# Altium integrated library Telephone.IntLib: 113 symbols
Pins are listed as number, name and electrical type; pins without a type are passive.

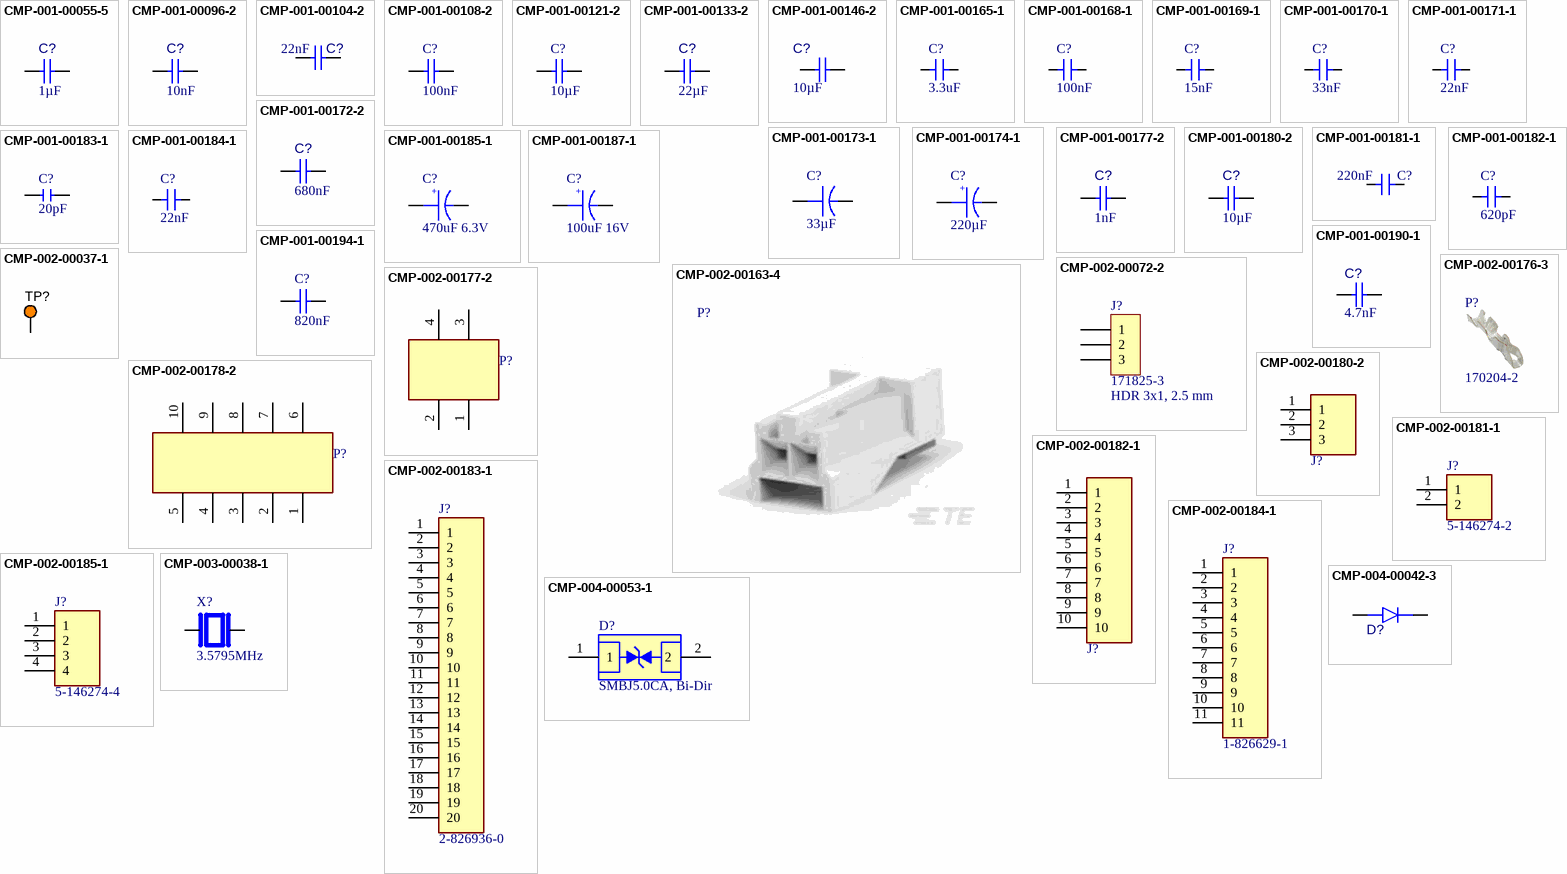
[diagram p0: symbols CMP-001-00055-5 to CMP-004-00053-1]

## CMP-001-00055-5
designator C?, comment value 1µF  (hidden comment: CL10A105KA8NNNC)
Ceramic capacitor SMD-0603 1000nF/25V X7R# K +-10%, Samsung, RoHS; Manufacturer: TDK; Manufacturer Part Number: CGA3E3X5R1E105K080AB; Manufacturer: Yageo; Manufacturer Part Number: CC0603KRX5R8BB105; Manufacturer Part Number: CL10A105KA8NFNC; Manufacturer: Sams; Voltage Rating: 25V; Tolerance: 10%; Dielectric: X5R; Pins: 2; RoHS Compliant: Yes; Mounting Technology: Surface Mount; Capacitor Type: Ceramic; Min Operating Temperature: -55°C; Case/Package: 0603; Max Operating Temperature: 85°C; Depth: 0.8mm; Height: 0.8mm; Lead Free: Lead Free; Length: 1.6mm; Series: CL; Voltage: 25V; Voltage Rating (DC): 25V; Manufacturer: Samsung; Manufacturer Part Number: CL10A105KA8NNNC; Component Type: Capacitors
footprint CAPC0603(1608)100_L (Chip Capacitor, Body 1.6x0.8mm, Height 1.0mm, IPC High Density)
pins: 1, 2

## CMP-001-00096-2
designator C?, comment value 10nF  (hidden comment: 06035C103KAT2A)
0603 10nF 50 V ±10 % Tolerance X7R Surface Mount Multilayer Ceramic Capacitor; Manufacturer: Kyocera AVX; Voltage Rating: 50V; Tolerance: 10%; Dissipation Factor: 2.5%; Insulation Resistance: 100GR; Case/Package: 0603; Pins: 2; Min Operating Temperature: -55°C; Max Operating Temperature: 125°C; Design Item ID: 06035C103KAT2A; Case Code (Metric): 1608; Category: Ceramic Capacitors; Contact Plating: Tin,Matte; Depth: 0.81mm; Dielectric: X7R; Dielectric Material: Ceramic; Height: 0.9mm; Lead Free: Lead Free; Length: 1.6mm; Manufacturer Part Number: 06035C103KAT2A; Mount: Surface Mount,PCB; Packaging: Tape and Reel; Radiation Hardening: No; REACH SVHC: No SVHC; RoHS: Yes; Stock 1: 4334081; Termination: SMD/SMT; Thickness: 0.035inch; Voltage: 50V; Voltage Rating (DC): 50V; Width: 0.032inch; ComponentLink1Description: https://datasheet.ciiva.com/2987/cx7r-2987824.pdf?src-supplier=Avnet; ComponentLink1URL: https://datasheet.ciiva.com/2987/cx7r-2987824.pdf?src-supplier=Avnet; ComponentLink2Description: https://datasheet.ciiva.com/1124/1679506-1124848.pdf?src-supplier=Element14; ComponentLink2URL: https://datasheet.ciiva.com/1124/1679506-1124848.pdf?src-supplier=Element14; ComponentLink3Description: https://datasheet.ciiva.com/7855/1679506-7855082.pdf?src-supplier=Element14; ComponentLink3URL: https://datasheet.ciiva.com/7855/1679506-7855082.pdf?src-supplier=Element14; ComponentLink4Description: https://datasheet.ciiva.com/150/cx7r-150227.pdf?src-supplier=Digi-Key; ComponentLink4URL: https://datasheet.ciiva.com/150/cx7r-150227.pdf?src-supplier=Digi-Key; ComponentLink5Description: https://datasheet.ciiva.com/150/cx7r-150229.pdf?src-supplier=Digi-Key; ComponentLink5URL: https://datasheet.ciiva.com/150/cx7r-150229.pdf?src-supplier=Digi-Key; Component Type: Capacitors
footprint C0603
pins: 1, 2

## CMP-001-00104-2
designator C?, comment value 22nF  (hidden comment: VJ0603Y223JXAAC)
Cap Ceramic 0.022uF 50V X7R 5% SMD 0603 150C Paper T/R; Manufacturer 1: Vishay Vitramon; Case/Package: 0603; RoHS Compliant: Yes; Min Operating Temperature: -55°C; Max Operating Temperature: 150°C; Tolerance: 5%; Design Item ID: VJ0603Y223JXAAC; Category: Ceramic Capacitors; Construction: Flat; Depth: 0.8mm; Dielectric: X7R; Length: 1.6mm; Manufacturer Part Number 1: VJ0603Y223JXAAC; Packaging: Tape and Reel; Radiation Hardening: No; RoHS: Yes; Voltage Rating (DC): 50V; ComponentLink1Description: http://components.arrow.com/part/dataview/0323_01552007?src-supplier=Arrow+Europe; ComponentLink1URL: http://components.arrow.com/part/dataview/0323_01552007?src-supplier=Arrow+Europe; ComponentLink2Description: http://www.vishay.com/docs/45199/vjcommercialseries.pdf?src-supplier=Digi-Key; ComponentLink2URL: http://www.vishay.com/docs/45199/vjcommercialseries.pdf?src-supplier=Digi-Key; ComponentLink3Description: http://www.vishay.com/docs/45199/commseri.pdf?src-supplier=Avnet; ComponentLink3URL: http://www.vishay.com/docs/45199/commseri.pdf?src-supplier=Avnet; ComponentLink4Description: http://www.vishay.com/docs/45199/commseri.pdf?src-supplier=Avnet+Europe; ComponentLink4URL: http://www.vishay.com/docs/45199/commseri.pdf?src-supplier=Avnet+Europe; Mounting Technology: Surface Mount; Pins: 2; Component Type: Capacitors
footprint C0603
pins: 1, 2

## CMP-001-00108-2
designator C?, comment value 100nF  (hidden comment: CC0603KRX7R8BB104)
YAGEO - CC0603KRX7R8BB104 - CERAMIC CAPACITOR, 0.1UF, 25V, X7R, 10%, 0603, FULL REEL; Case/Package: 0603; Pins: 2; RoHS Compliant: Yes; Min Operating Temperature: -55°C; Max Operating Temperature: 125°C; Voltage Rating: 25V; Tolerance: 10%; Design Item ID: CC0603KRX7R8BB104; Case Code (Metric): 1608; Category: Ceramic Capacitors; Depth: 0.8mm; Dielectric: X7R; Halogen Free: Halogen Free; Height: 0.8mm; Lead Free: Lead Free; Length: 1.6mm; Manufacturer 1: Yageo; Manufacturer Part Number 1: CC0603KRX7R8BB104; Mount: Surface Mount; Package Quantity: 1; Packaging: Tape and Reel; Pricing 1: 1=0.10000, 10=0.05000, 50=0.02720, 100=0.02220, 500=0.01586, 1000=0.01246 (USD); Radiation Hardening: No; REACH SVHC: Unknown; Resistor Type: Ceramic; RoHS: Yes; Series: CC; Source: PTZLib.SchLib; Stock 1: 4053185; Termination: SMD/SMT; Thickness: 0.035inch; Voltage: 25V; Voltage Rating (DC): 25V; Width: 0.8mm; ComponentLink1Description: https://datasheet.ciiva.com/144/mlccorderingcode-144075.pdf?src-supplier=Digi-Key; ComponentLink1URL: https://datasheet.ciiva.com/144/mlccorderingcode-144075.pdf?src-supplier=Digi-Key; ComponentLink2Description: https://datasheet.ciiva.com/11786/0900766b80c10176-11786120.pdf?src-supplier=RSComponents; ComponentLink2URL: https://datasheet.ciiva.com/11786/0900766b80c10176-11786120.pdf?src-supplier=RSComponents; ComponentLink3Description: https://datasheet.ciiva.com/7978/1489800-7978155.pdf?src-supplier=Element14; ComponentLink3URL: https://datasheet.ciiva.com/7978/1489800-7978155.pdf?src-supplier=Element14; ComponentLink4Description: https://datasheet.ciiva.com/28450/1489800-28450584.pdf?src-supplier=Element14; ComponentLink4URL: https://datasheet.ciiva.com/28450/1489800-28450584.pdf?src-supplier=Element14; ComponentLink5Description: https://datasheet.ciiva.com/144/mlccorderingcode-144074.pdf?src-supplier=Digi-Key; ComponentLink5URL: https://datasheet.ciiva.com/144/mlccorderingcode-144074.pdf?src-supplier=Digi-Key; ComponentLink6Description: https://datasheet.ciiva.com/144/mlccorderingcode-144073.pdf?src-supplier=Digi-Key; ComponentLink6URL: https://datasheet.ciiva.com/144/mlccorderingcode-144073.pdf?src-supplier=Digi-Key; ComponentLink7Description: https://datasheet.ciiva.com/13389/upy-gphc-x7r-6-3v-to-50v-8-13389352.pdf?src-supplier=Mouser; ComponentLink7URL: https://datasheet.ciiva.com/13389/upy-gphc-x7r-6-3v-to-50v-8-13389352.pdf?src-supplier=Mouser; ComponentLink8Description: https://datasheet.ciiva.com/11587/upy-gphc-x7r-6-3v-to-50v-8-11587208.pdf?src-supplier=Avnet; ComponentLink8URL: https://datasheet.ciiva.com/11587/upy-gphc-x7r-6-3v-to-50v-8-11587208.pdf?src-supplier=Avnet; ComponentLink9Description: https://datasheet.ciiva.com/26829/getdatasheetpartid-403577-26829431.pdf?src-supplier=Verical; ComponentLink9URL: https://datasheet.ciiva.com/26829/getdatasheetpartid-403577-26829431.pdf?src-supplier=Verical; ComponentLink10Description: https://datasheet.ciiva.com/17434/upy-gphc-x7r-6-3v-to-50v-8-17434263.pdf?src-supplier=Avnet+Europe; ComponentLink10URL: https://datasheet.ciiva.com/17434/upy-gphc-x7r-6-3v-to-50v-8-17434263.pdf?src-supplier=Avnet+Europe; Component Type: Capacitors
footprint C0603
pins: 1, 2

## CMP-001-00121-2
designator C?, comment value 10µF  (hidden comment: GRM32ER7YA106KA12L)
Capacitor 10 uF 35 VDC 1210, GRM32ER7YA106KA12L, Murata; Voltage Rating: 35V; Tolerance: 10%; Dielectric: X7R; Material: Ceramic; Case/Package: 1210; RoHS Compliant: Yes; Min Operating Temperature: -55°C; Max Operating Temperature: 125°C; Design Item ID: GRM32ER7YA106KA12L; Case Code (Metric): 3225; Category: Ceramic Capacitors; Construction: Flat; Depth: 2.5mm; Height: 2.5mm; Lead Free: Lead Free; Length: 3.2mm; Manufacturer 1: Murata; Manufacturer Part Number 1: GRM32ER7YA106KA12L; Mount: Surface Mount; Package Quantity: 1; Packaging: Tape and Reel; Pricing 1: 1=0.96000, 10=0.72800, 50=0.60520, 100=0.52110, 500=0.40344 (USD); Radiation Hardening: No; REACH SVHC: No SVHC; RoHS: Yes; Series: GRM; Source: PTZLib.SchLib; Termination: SMD/SMT; Thickness: 0.106inch; Voltage: 35V; Voltage Rating (DC): 35V; Width: 2.5mm; ComponentLink1Description: https://datasheet.ciiva.com/22782/1747495-22782197.pdf?src-supplier=Farnell; ComponentLink1URL: https://datasheet.ciiva.com/22782/1747495-22782197.pdf?src-supplier=Farnell; ComponentLink2Description: https://datasheet.ciiva.com/3777/grm32er7ya106ka1223-3777248.pdf?src-supplier=Arrow+Electronics; ComponentLink2URL: https://datasheet.ciiva.com/3777/grm32er7ya106ka1223-3777248.pdf?src-supplier=Arrow+Electronics; ComponentLink3Description: https://datasheet.ciiva.com/11789/0900766b80ef921d-11789082.pdf?src-supplier=RSComponents; ComponentLink3URL: https://datasheet.ciiva.com/11789/0900766b80ef921d-11789082.pdf?src-supplier=RSComponents; ComponentLink4Description: https://datasheet.ciiva.com/29199/455226-da-01-en-vs-kondensator-1210-29199348.pdf?src-supplier=Conrad; ComponentLink4URL: https://datasheet.ciiva.com/29199/455226-da-01-en-vs-kondensator-1210-29199348.pdf?src-supplier=Conrad; ComponentLink5Description: https://datasheet.ciiva.com/29202/451166-da-01-de-vs-chip-kond-1210-10-0-uf-10pr-35-0v-x7r-29202478.pdf?src-supplier=Conrad; ComponentLink5URL: https://datasheet.ciiva.com/29202/451166-da-01-de-vs-chip-kond-1210-10-0-uf-10pr-35-0v-x7r-29202478.pdf?src-supplier=Conrad; ComponentLink6Description: https://datasheet.ciiva.com/143/partnumbering-e-01-143241.pdf?src-supplier=Digi-Key; ComponentLink6URL: https://datasheet.ciiva.com/143/partnumbering-e-01-143241.pdf?src-supplier=Digi-Key; ComponentLink7Description: https://datasheet.ciiva.com/143/partnumbering-e-01-143242.pdf?src-supplier=Digi-Key; ComponentLink7URL: https://datasheet.ciiva.com/143/partnumbering-e-01-143242.pdf?src-supplier=Digi-Key; ComponentLink8Description: https://datasheet.ciiva.com/11607/product-11607514.pdf?src-supplier=Avnet; ComponentLink8URL: https://datasheet.ciiva.com/11607/product-11607514.pdf?src-supplier=Avnet; ComponentLink9Description: https://datasheet.ciiva.com/14116/grmseries-highdielectrictype-eng-14116380.pdf?src-supplier=Distrelec; ComponentLink9URL: https://datasheet.ciiva.com/14116/grmseries-highdielectrictype-eng-14116380.pdf?src-supplier=Distrelec; ComponentLink10Description: https://datasheet.ciiva.com/7937/1747495-7937786.pdf?src-supplier=Element14; ComponentLink10URL: https://datasheet.ciiva.com/7937/1747495-7937786.pdf?src-supplier=Element14; Component Type: Capacitors
footprint C1210
pins: 1, 2

## CMP-001-00133-2
designator C?, comment value 22µF  (hidden comment: CL21A226KPCLRNC)
Cap Ceramic 22uF 10V X5R 10% SMD 0805 85C T/R; Manufacturer: Samsung; Capacitor Type: Ceramic Capacitors; Case/Package: 0805; Max Operating Temperature: 85°C; Min Operating Temperature: -55°C; Mounting Technology: Surface Mount; Pins: 2; RoHS Compliant: Yes; Tolerance: 10%; Voltage Rating: 10V; Case Code (Imperial): 0805; Case Code (Metric): 2012; Depth: 1.25mm; Dielectric: X5R; Lead Free: Lead Free; Length: 0.079inch; Packaging: Tape and Reel; Radiation Hardening: No; Series: CL; Thickness: 0.037inch; Width: 0.049inch; Manufacturer Part Number: CL21A226KPCLRNC; Component Type: Capacitors
footprint C0805
pins: 1, 2

## CMP-001-00146-2
designator C?, comment value 10µF  (hidden comment: C1210C106M5RACTU)
3225 C 10uF Ceramic Multilayer Capacitor; 50 V; +85degC; X7R Dielectric; +/-20%; Manufacturer: KEMET; Voltage Rating: 50V; Tolerance: 20%; Case/Package: 1210; RoHS Compliant: Yes; Min Operating Temperature: -55°C; Max Operating Temperature: 125°C; Design Item ID: C1210C106M5RACTU; Case Code (Metric): 3225; Category: Ceramic Capacitors; Component Type: Standard; Depth: 2.5mm; Dielectric: X7R; Dielectric Material: Ceramic; Height: 2.5mm; Length: 3.2mm; Manufacturer Part Number: C1210C106M5RACTU; Packaging: Tape and Reel; Thickness: 0.11inch; Voltage: 50V; Voltage Rating (DC): 50V; Weight: 0.000564oz; Width: 0.098inch; ComponentLink1Description: http://www.farnell.com/datasheets/2746479.pdf?src-supplier=Farnell; ComponentLink1URL: http://www.farnell.com/datasheets/2746479.pdf?src-supplier=Farnell; ComponentLink2Description: http://uk.rs-online.com/webdocs/1515/0900766b8151523a.pdf?src-supplier=RSComponents; ComponentLink2URL: http://uk.rs-online.com/webdocs/1515/0900766b8151523a.pdf?src-supplier=RSComponents; ComponentLink3Description: http://www.farnell.com/datasheets/2323917.pdf?src-supplier=Farnell; ComponentLink3URL: http://www.farnell.com/datasheets/2323917.pdf?src-supplier=Farnell; ComponentLink4Description: http://www.mouser.com/ds/2/212/KEM_C1002_X7R_SMD-357932.pdf?src-supplier=Mouser; ComponentLink4URL: http://www.mouser.com/ds/2/212/KEM_C1002_X7R_SMD-357932.pdf?src-supplier=Mouser; ComponentLink5Description: http://www.kemet.com/Lists/ProductCatalog/Attachments/53/KEM_C1002_X7R_SMD.pdf?src-supplier=Digi-Key; ComponentLink5URL: http://www.kemet.com/Lists/ProductCatalog/Attachments/53/KEM_C1002_X7R_SMD.pdf?src-supplier=Digi-Key; ComponentLink6Description: http://www.farnell.com/datasheets/2746479.pdf?src-supplier=Newark; ComponentLink6URL: http://www.farnell.com/datasheets/2746479.pdf?src-supplier=Newark; ComponentLink7Description: https://api.kemet.com/component-edge/download/datasheet/C1210C106M5RACTU.pdf?src-supplier=Digi-Key; ComponentLink7URL: https://api.kemet.com/component-edge/download/datasheet/C1210C106M5RACTU.pdf?src-supplier=Digi-Key; Mounting Technology: Surface Mount; Pins: 2; Component Type: Capacitors
footprint C1210
pins: 1, 2

## CMP-001-00165-1
designator C?  value 3.3uF  (hidden comment: CMP-001-00165-1)
Chip Capacitor 0603 MLCC X5R 3.3 uF+/- 10% 6.3 V T&R GP; Manufacturer: Walsin Technologies; Manufacturer Part Number: 0603X335K6R3CT; RoHS: Yes; Category: Ceramic Capacitors; Stock 1: 7326; Pricing 1: 1=0.2, 10=0.137, 50=0.137, 100=0.069, 1000=0.042, 10000=0.032 (USD); RoHS Compliant: Yes; Design Item ID: 0603X335K6R3CT; Component Type: Standard; Pin Count: 2; Source: V4-TEL.SCHLIB; Component Type: Capacitors
footprint 0603
pins: 1, 2

## CMP-001-00168-1
designator C?  value 100nF  (hidden comment: CMP-001-00168-1)
Capacitor, Ceramic; 0.1UF; Chip; Case 0805; +/-10%; 50WVDC; SMD; X7R; 2.5% Df; 0.037IN. ,; Manufacturer: Kyocera AVX; Manufacturer Part Number: 08055C104KAT2A; Tolerance: 10%; Voltage Rating (DC): 50V; RoHS: Yes; Category: Ceramic Capacitors; Stock 1: 2002566; Pricing 1: 1=0.1, 10=0.037, 50=0.037, 100=0.022, 1000=0.017, 10000=0.013 (USD); Case/Package: 0805; Case Code (Metric): 2012; Dielectric Material: Ceramic; Weight: 0.001411oz; Min Operating Temperature: -55°C; Max Operating Temperature: 125°C; Packaging: Cut Tape; Dielectric: X7R; Termination: Standard; Package Quantity: 4000; Series: MLCC X7R; Voltage: 50V; Length: 2mm; Width: 1.2mm; Height: 0.5mm; RoHS Compliant: Yes; Lead Free: Lead Free; ComponentLink1URL: https://datasheet.ciiva.com/11786/0900766b802d4698-11786116.pdf?src-supplier=Rs; ComponentLink1Description: https://datasheet.ciiva.com/11786/0900766b802d4698-11786116.pdf?src-supplier=Rs; ComponentLink2URL: https://datasheet.ciiva.com/19475/2009691-19475858.pdf?src-supplier=Jameco; ComponentLink2Description: https://datasheet.ciiva.com/19475/2009691-19475858.pdf?src-supplier=Jameco; ComponentLink3URL: https://datasheet.ciiva.com/2988/cx7r-2988014.pdf?src-supplier=Avnet; ComponentLink3Description: https://datasheet.ciiva.com/2988/cx7r-2988014.pdf?src-supplier=Avnet; ComponentLink4URL: https://datasheet.ciiva.com/16199/cx7r-16199014.pdf?src-supplier=Future+Electronics; ComponentLink4Description: https://datasheet.ciiva.com/16199/cx7r-16199014.pdf?src-supplier=Future+Electronics; ComponentLink5URL: https://datasheet.ciiva.com/11504/cx7r-11504044.pdf?src-supplier=Avnet; ComponentLink5Description: https://datasheet.ciiva.com/11504/cx7r-11504044.pdf?src-supplier=Avnet; ComponentLink6URL: https://datasheet.ciiva.com/150/cx7r-150258.pdf?src-supplier=Digi-Key; ComponentLink6Description: https://datasheet.ciiva.com/150/cx7r-150258.pdf?src-supplier=Digi-Key; ComponentLink7URL: https://datasheet.ciiva.com/150/cx7r-150257.pdf?src-supplier=Digi-Key; ComponentLink7Description: https://datasheet.ciiva.com/150/cx7r-150257.pdf?src-supplier=Digi-Key; ComponentLink8URL: https://datasheet.ciiva.com/150/cx7r-150259.pdf?src-supplier=Digi-Key; ComponentLink8Description: https://datasheet.ciiva.com/150/cx7r-150259.pdf?src-supplier=Digi-Key; ComponentLink9URL: https://datasheet.ciiva.com/7812/cx7r-7812079.pdf?src-supplier=Element14; ComponentLink9Description: https://datasheet.ciiva.com/7812/cx7r-7812079.pdf?src-supplier=Element14; ComponentLink10URL: https://datasheet.ciiva.com/5416/cx7r-5416959.pdf?src-supplier=Mouser; ComponentLink10Description: https://datasheet.ciiva.com/5416/cx7r-5416959.pdf?src-supplier=Mouser; Design Item ID: 08055C104KAT2A; Component Type: Standard; Pin Count: 2; Source: V4-TEL.SCHLIB; Component Type: Capacitors
footprint 0805
pins: 1, 2

## CMP-001-00169-1
designator C?  value 15nF  (hidden comment: CMP-001-00169-1)
Multilayer Ceramic Capacitor, 0.015 F, 10%, X7R, 50 V, 0805 [2012 Metric] RoHS Compliant: Yes; Manufacturer: Walsin Technologies; Manufacturer Part Number: 0805B153K500CT; Voltage Rating: 50V; RoHS: Yes; Category: Ceramic Capacitors; Stock 1: 4000; Pricing 1: 1=0.1, 10=0.071, 50=0.071, 100=0.032, 1000=0.019, 10000=0.016 (USD); Case/Package: 0805; Case Code (Metric): 2012; Min Operating Temperature: -55°C; Max Operating Temperature: 125°C; Tolerance: 10%; Packaging: Tape and Reel; Dielectric: X7R; Voltage Rating (DC): 50V; Length: 2mm; Depth: 1.25mm; Radiation Hardening: No; RoHS Compliant: Yes; Reach SVHC Compliant: Unknown; ComponentLink1URL: https://datasheet.ciiva.com/26831/getdatasheetpartid-415808-26831383.pdf?src-supplier=Verical; ComponentLink1Description: https://datasheet.ciiva.com/26831/getdatasheetpartid-415808-26831383.pdf?src-supplier=Verical; Design Item ID: 0805B153K500CT; Component Type: Standard; Pin Count: 2; Source: V4-TEL.SCHLIB; Component Type: Capacitors
footprint 0805
pins: 1, 2

## CMP-001-00170-1
designator C?  value 33nF  (hidden comment: CMP-001-00170-1)
Chip Capacitor 0805 MLCC X7R 0.033 uF+/ -20% 100 V T&R MH; Manufacturer: Walsin Technologies; Manufacturer Part Number: 0805B333M101CT; Tolerance: 20%; RoHS: Yes; Category: Ceramic Capacitors; Stock 1: 197; Pricing 1: 1=0.11, 10=0.082, 50=0.082, 100=0.039, 1000=0.023, 10000=0.016 (USD); Case/Package: 0805; Min Operating Temperature: -55°C; Max Operating Temperature: 125°C; Packaging: Tape and Reel; Dielectric: X7R; Length: 2mm; Depth: 1.25mm; RoHS Compliant: Yes; Design Item ID: 0805B333M101CT; Component Type: Standard; Pin Count: 2; Source: V4-TEL.SCHLIB; Component Type: Capacitors
footprint 0805
pins: 1, 2

## CMP-001-00171-1
designator C?  value 22nF  (hidden comment: CMP-001-00171-1)
Capacitor SMD Ceramic 1206 400Vdc X7R Dielectric 0.022uF ±10% 125°C T/R; Manufacturer: Kyocera AVX; Manufacturer Part Number: 12068C223KAT2A; Voltage Rating (DC): 400V; RoHS: Yes; Category: Ceramic Capacitors; Stock 1: 2302; Pricing 1: 1=0.72, 10=0.531, 50=0.531, 100=0.364, 1000=0.243, 10000=0.215 (USD); Min Operating Temperature: -55°C; Max Operating Temperature: 125°C; Package Quantity: 2000; Tolerance: 10%; Packaging: Tape and Reel; Dielectric: X7R; ComponentLink1URL: http://www.mouser.com/ds/2/40/X7RDielectric-777024.pdf?src-supplier=Mouser; ComponentLink1Description: http://www.mouser.com/ds/2/40/X7RDielectric-777024.pdf?src-supplier=Mouser; Design Item ID: 12068C223KAT2A; Component Type: Standard; Pin Count: 2; Source: V4-TEL.SCHLIB; Component Type: Capacitors
footprint 1206
pins: 1, 2

## CMP-001-00172-2
designator C?, comment value 680nF  (hidden comment: 1812B684M251CT)
Cap Cer 0.68UF 250V X7R 1812; Manufacturer: Walsin Technologies; Manufacturer Part Number: 1812B684M251CT; ComponentLink1URL: https://datasheet.octopart.com/1812B684M251CT-Walsin-Technologies-datasheet-136533367.pdf?src-supplier=TECHDesign; ComponentLink1Description: https://datasheet.octopart.com/1812B684M251CT-Walsin-Technologies-datasheet-136533367.pdf?src-supplier=TECHDesign; ComponentLink2URL: https://datasheet.octopart.com/1812B684M251CT-Walsin-Technologies-datasheet-26371553.pdf; ComponentLink2Description: https://datasheet.octopart.com/1812B684M251CT-Walsin-Technologies-datasheet-26371553.pdf; Pins: 2; Voltage Rating: 250V; Component Type: Capacitors
footprint C1812
pins: 1, 2

## CMP-001-00173-1
designator C?  value 33µF  (hidden comment: CMP-001-00173-1)
SMD Aluminium Electrolytic Capacitor, WCAP-ASLI Series, 33 F, 6.3 V, Radial Can - SMD, 4 mm RoHS Compliant: Yes; Manufacturer: Wurth Electronics; Manufacturer Part Number: 865080140003; Voltage Rating: 6.3V; Ripple Current: 82mA; Impedance: 1.9R; Tolerance: 20%; RoHS: Yes; Category: Aluminum Electrolytic Capacitors; Stock 1: 4789; Pricing 1: 1=0.18, 10=0.18, 50=0.169, 100=0.158, 1000=0.102, 10000=0.102 (USD); Mount: Surface Mount; Case/Package: Radial; Min Operating Temperature: -55°C; Max Operating Temperature: 105°C; Package Quantity: 1; Packaging: Cut Tape; Ripple Current (AC): 82mA; Voltage Rating (DC): 6.3V; Series: WCAP-ASLI; Diameter: 4mm; Height: 5.5mm; Height - Seated (Max): 0.217inch; RoHS Compliant: Yes; Reach SVHC Compliant: Unknown; ComponentLink1URL: http://www.farnell.com/datasheets/1880086.pdf?src-supplier=Farnell; ComponentLink1Description: http://www.farnell.com/datasheets/1880086.pdf?src-supplier=Farnell; ComponentLink2URL: http://www.farnell.com/datasheets/1880086.pdf?src-supplier=Element14; ComponentLink2Description: http://www.farnell.com/datasheets/1880086.pdf?src-supplier=Element14; ComponentLink3URL: http://katalog.we-online.de/pbs/datasheet/865080140003.pdf?src-supplier=Digi-Key; ComponentLink3Description: http://katalog.we-online.de/pbs/datasheet/865080140003.pdf?src-supplier=Digi-Key; ComponentLink4URL: https://katalog.we-online.de/pbs/datasheet/865080140003.pdf?src-supplier=Digi-Key; ComponentLink4Description: https://katalog.we-online.de/pbs/datasheet/865080140003.pdf?src-supplier=Digi-Key; Design Item ID: 865080140003; Component Type: Standard; Pin Count: 2; Source: V4-TEL.SCHLIB; Component Type: Capacitors
footprint CAPAE6342X55M 22UF 6.3V
pins: 1, 2

## CMP-001-00174-1
designator C?  value 220µF  (hidden comment: CMP-001-00174-1)
Smd Aluminium Electrolytic Capacitor, Wcap-Asli Series, 220 F, 6.3 V, Radial Can - Smd, 6.3 Mm Rohs Compliant: Yes; Manufacturer: Wurth Electronics; Manufacturer Part Number: 865080143009; Voltage Rating: 6.3V; Ripple Current: 240mA; Impedance: 480mR; Tolerance: 20%; RoHS: Yes; Category: Aluminum Electrolytic Capacitors; Stock 1: 1045; Pricing 1: 1=0.28, 10=0.277, 50=0.237, 100=0.207, 1000=0.152, 10000=0.151 (USD); Mount: Surface Mount; Case/Package: Radial; Min Operating Temperature: -55°C; Max Operating Temperature: 105°C; Package Quantity: 1000; Packaging: Cut Tape; Ripple Current (AC): 240mA; Voltage Rating (DC): 6.3V; Series: WCAP-ASLI; Diameter: 6.3mm; Height: 5.5mm; Height - Seated (Max): 0.217inch; RoHS Compliant: Yes; Reach SVHC Compliant: Unknown; ComponentLink1URL: http://www.farnell.com/datasheets/1880092.pdf?src-supplier=Farnell; ComponentLink1Description: http://www.farnell.com/datasheets/1880092.pdf?src-supplier=Farnell; ComponentLink2URL: http://www.farnell.com/datasheets/1880092.pdf?src-supplier=Element14; ComponentLink2Description: http://www.farnell.com/datasheets/1880092.pdf?src-supplier=Element14; ComponentLink3URL: http://www.farnell.com/datasheets/1880092.pdf?src-supplier=Newark; ComponentLink3Description: http://www.farnell.com/datasheets/1880092.pdf?src-supplier=Newark; ComponentLink4URL: https://katalog.we-online.de/pbs/datasheet/865080143009.pdf?src-supplier=Digi-Key; ComponentLink4Description: https://katalog.we-online.de/pbs/datasheet/865080143009.pdf?src-supplier=Digi-Key; ComponentLink5URL: http://katalog.we-online.de/pbs/datasheet/865080143009.pdf?src-supplier=Digi-Key; ComponentLink5Description: http://katalog.we-online.de/pbs/datasheet/865080143009.pdf?src-supplier=Digi-Key; Design Item ID: 865080143009; Component Type: Standard; Pin Count: 2; Source: V4-TEL.SCHLIB; Component Type: Capacitors
footprint CAPAE9290X56M 220UF 6.3V
pins: 1, 2
text: +

## CMP-001-00177-2
designator C?, comment value 1nF  (hidden comment: 885342206003)
Cap, 1000PF, 250V, 10%, X7R, 0603; Manufacturer: Wurth Electronics; Case/Package: 0603; Min Operating Temperature: -55°C; Max Operating Temperature: 125°C; Voltage Rating: 250V; Tolerance: 10%; Design Item ID: 885342206003; Case Code (Metric): 1608; Category: Ceramic Capacitors; Component Type: Standard; Manufacturer Part Number: 885342206003; Mount: Surface Mount; Packaging: Cut Tape; Pin Count: 2; Pricing 1: 1=0.1, 10=0.069, 50=0.069, 100=0.062, 1000=0.055, 10000=0.042 (USD); RoHS: No; Series: WCAP-CSMH; Source: V4-TEL.SCHLIB; Stock 1: 14686; ComponentLink1Description: http://www.farnell.com/datasheets/2547029.pdf?src-supplier=Farnell; ComponentLink1URL: http://www.farnell.com/datasheets/2547029.pdf?src-supplier=Farnell; ComponentLink2Description: http://www.farnell.com/datasheets/2547029.pdf?src-supplier=Newark; ComponentLink2URL: http://www.farnell.com/datasheets/2547029.pdf?src-supplier=Newark; ComponentLink3Description: https://katalog.we-online.de/pbs/datasheet/885342206003.pdf?src-supplier=Digi-Key; ComponentLink3URL: https://katalog.we-online.de/pbs/datasheet/885342206003.pdf?src-supplier=Digi-Key; Component Type: Capacitors
footprint 0603
pins: 1, 2

## CMP-001-00180-2
designator C?, comment value 10µF  (hidden comment: C0805C106K9PACTU)
Ceramic Capacitor, 10UF, 6.3V, X5R, 10%, 0805, Full Reel; Manufacturer: KEMET; Dissipation Factor: 5%; Capacitor Type: Ceramic Capacitors; Manufacturer Part Number: C0805C106K9PACTU; Mount: Surface Mount; Case/Package: 0805; Case Code (Metric): 2012; Dielectric Material: Ceramic; Contact Material: Tin; Min Operating Temperature: -55°C; Max Operating Temperature: 85°C; Tolerance: 10%; Voltage Rating (DC): 6.3V; Dielectric: X5R; Packaging: Tape and Reel; Voltage Rating: 6.3V; Series: SMD Comm X5R; Construction: Flat; Length: 2mm; Width: 1.2mm; Height: 1.25mm; Depth: 1.25mm; Lead Pitch: 0.75mm; Radiation Hardening: No; RoHS Compliant: Yes; Lead Free: Lead Free; Reach SVHC Compliant: No; ComponentLink1URL: https://datasheet.ciiva.com/7842/kem-c1006-x5r-smd-7842200.pdf?src-supplier=Element14; ComponentLink1Description: https://datasheet.ciiva.com/7842/kem-c1006-x5r-smd-7842200.pdf?src-supplier=Element14; ComponentLink2URL: https://datasheet.ciiva.com/7842/kem-c1006-x5r-smd-7842201.pdf?src-supplier=Element14; ComponentLink2Description: https://datasheet.ciiva.com/7842/kem-c1006-x5r-smd-7842201.pdf?src-supplier=Element14; ComponentLink3URL: https://datasheet.ciiva.com/7842/40889-7842553.pdf?src-supplier=Element14; ComponentLink3Description: https://datasheet.ciiva.com/7842/40889-7842553.pdf?src-supplier=Element14; ComponentLink4URL: https://datasheet.ciiva.com/7842/40889-7842554.pdf?src-supplier=Element14; ComponentLink4Description: https://datasheet.ciiva.com/7842/40889-7842554.pdf?src-supplier=Element14; ComponentLink5URL: https://datasheet.ciiva.com/18193/getdatasheetpartid-320652-18193500.pdf?src-supplier=Verical; ComponentLink5Description: https://datasheet.ciiva.com/18193/getdatasheetpartid-320652-18193500.pdf?src-supplier=Verical; Pins: 2; Mounting Technology: SMD/SMT; Component Type: Capacitors
footprint 0805
pins: 1, 2

## CMP-001-00181-1
designator C?  value 220nF  (hidden comment: CMP-001-00181-1)
Cap Ceramic 0.22uF 50V X7R 10% SMD 0805 125°C Plastic T/R; Manufacturer: KEMET; Manufacturer Part Number: C0805C224K5RAC7210; RoHS: Yes; Category: Ceramic Capacitors; Stock 1: 10097; Pricing 1: 1=0.14, 10=0.094, 50=0.094, 100=0.048, 1000=0.029, 10000=0.022 (USD); Mount: Surface Mount; Case/Package: Ceramic; Dielectric Material: Ceramic; Contact Plating: Tin,Matte; Min Operating Temperature: -55°C; Max Operating Temperature: 125°C; Packaging: Tape and Reel; Tolerance: 10%; Dielectric: X7R; Voltage Rating (DC): 50V; Construction: Flat; Length: 2mm; Depth: 1.25mm; Radiation Hardening: No; RoHS Compliant: Yes; ComponentLink1URL: https://www.verical.com/server-webapp/html/getDatasheet?partID=708051&src-supplier=Verical; ComponentLink1Description: https://www.verical.com/server-webapp/html/getDatasheet?partID=708051&src-supplier=Verical; ComponentLink2URL: http://components.arrow.com/part/dataview/48344387S408465N7429?src-supplier=Arrow+Electronics; ComponentLink2Description: http://components.arrow.com/part/dataview/48344387S408465N7429?src-supplier=Arrow+Electronics; ComponentLink3URL: http://capacitoredge.kemet.com/capedge2/DataSheet?pn=C0805C224K5RAC7210&src-supplier=Avnet; ComponentLink3Description: http://capacitoredge.kemet.com/capedge2/DataSheet?pn=C0805C224K5RAC7210&src-supplier=Avnet; Design Item ID: C0805C224K5RAC7210; Component Type: Standard; Pin Count: 2; Source: V4-TEL.SCHLIB; Component Type: Capacitors
footprint 0805
pins: 1, 2

## CMP-001-00182-1
designator C?  value 620pF  (hidden comment: CMP-001-00182-1)
Manufacturer: KEMET; Manufacturer Part Number: C0805C621K1HACTU; RoHS: Yes; Category: Ceramic Capacitors; Stock 1: 15121; Pricing 1: 1=0.1, 10=0.072, 50=0.072, 100=0.033, 1000=0.019, 10000=0.016 (USD); RoHS Compliant: Yes; Design Item ID: C0805C621K1HACTU; Component Type: Standard; Pin Count: 2; Source: V4-TEL.SCHLIB; Component Type: Capacitors
footprint 0805
pins: 1, 2

## CMP-001-00183-1
designator C?  value 20pF  (hidden comment: CMP-001-00183-1)
CAP CER 20PF 50V NPO 0805; Manufacturer: Yageo; Manufacturer Part Number: CC0805JRNPO9BN200; Tolerance: 5%; Dielectric: NP0; RoHS: Yes; Category: Ceramic Capacitors; Stock: 3029; Pricing: 1=0.13, 10=0.054, 50=0.054, 100=0.032, 1000=0.026, 10000=0.017 (USD); Mounting Technology: Surface Mount; Case/Package: 0805; Pins: 2; Case Code (Metric): 2012; Min Operating Temperature: -55°C; Max Operating Temperature: 125°C; Voltage Rating: 50V; Packaging: Tape and Reel; Voltage Rating (DC): 50V; Termination: SMD/SMT; Series: CC; Length: 0.079inch; Width: 1.25mm; Thickness: 0.028inch; Lead Free: Lead Free; ComponentLink1URL: https://datasheet.ciiva.com/5427/upy-gp-np0-16v-to-50v-8-5427416.pdf?src-supplier=Mouser; ComponentLink1Description: https://datasheet.ciiva.com/5427/upy-gp-np0-16v-to-50v-8-5427416.pdf?src-supplier=Mouser; Design Item ID: CC0805JRNPO9BN200; Component Type: Standard; Pin Count: 2; Source: V4-TEL.SCHLIB; Component Type: Capacitors
footprint 0805
pins: 1, 2

## CMP-001-00184-1
designator C?  value 22nF  (hidden comment: CMP-001-00184-1)
Surface Mount Ceramic Multilayer Capacitor 0.022uF 10% X7R 100V 0805 Paper T/R; Manufacturer: Yageo; Manufacturer Part Number: CC0805KRX7R0BB223; RoHS: Yes; Category: Ceramic Capacitors; Stock 1: 33056; Pricing 1: 1=0.1, 10=0.041, 50=0.041, 100=0.024, 1000=0.02, 10000=0.012 (USD); Mount: Surface Mount; Case/Package: 0805; Case Code (Metric): 2012; Weight: 0.000194oz; Min Operating Temperature: -55°C; Max Operating Temperature: 125°C; Packaging: Tape and Reel; Package Quantity: 1; Tolerance: 10%; Voltage Rating: 100V; Dielectric: X7R; Voltage Rating (DC): 100V; Termination: SMD/SMT; Voltage: 100V; Series: CC; Length: 2mm; Width: 0.049inch; Height: 0.85mm; Thickness: 0.037inch; Depth: 1.25mm; Radiation Hardening: No; Lead Free: Lead Free; RoHS Compliant: Yes; Reach SVHC Compliant: Unknown; ComponentLink1URL: https://datasheet.ciiva.com/25613/0900766b80528518-25613134.pdf?src-supplier=Rs; ComponentLink1Description: https://datasheet.ciiva.com/25613/0900766b80528518-25613134.pdf?src-supplier=Rs; ComponentLink2URL: https://datasheet.ciiva.com/11786/0900766b80d84f7f-11786064.pdf?src-supplier=Rs; ComponentLink2Description: https://datasheet.ciiva.com/11786/0900766b80d84f7f-11786064.pdf?src-supplier=Rs; ComponentLink3URL: https://datasheet.ciiva.com/7978/1447671-7978202.pdf?src-supplier=Element14; ComponentLink3Description: https://datasheet.ciiva.com/7978/1447671-7978202.pdf?src-supplier=Element14; ComponentLink4URL: https://datasheet.ciiva.com/176/mlccorderingcode-176941.pdf?src-supplier=Digi-Key; ComponentLink4Description: https://datasheet.ciiva.com/176/mlccorderingcode-176941.pdf?src-supplier=Digi-Key; ComponentLink5URL: https://datasheet.ciiva.com/176/mlccorderingcode-176940.pdf?src-supplier=Digi-Key; ComponentLink5Description: https://datasheet.ciiva.com/176/mlccorderingcode-176940.pdf?src-supplier=Digi-Key; ComponentLink6URL: https://datasheet.ciiva.com/176/mlccorderingcode-176942.pdf?src-supplier=Digi-Key; ComponentLink6Description: https://datasheet.ciiva.com/176/mlccorderingcode-176942.pdf?src-supplier=Digi-Key; ComponentLink7URL: https://datasheet.ciiva.com/11465/upy-np0x7r-mv-100-to-630v-9-11465277.pdf?src-supplier=Avnet; ComponentLink7Description: https://datasheet.ciiva.com/11465/upy-np0x7r-mv-100-to-630v-9-11465277.pdf?src-supplier=Avnet; ComponentLink8URL: https://datasheet.ciiva.com/17033/upy-np0x7r-mv-100-to-630v-9-17033259.pdf?src-supplier=Future+Electronics; ComponentLink8Description: https://datasheet.ciiva.com/17033/upy-np0x7r-mv-100-to-630v-9-17033259.pdf?src-supplier=Future+Electronics; ComponentLink9URL: https://datasheet.ciiva.com/26829/getdatasheetpartid-251804-26829547.pdf?src-supplier=Verical; ComponentLink9Description: https://datasheet.ciiva.com/26829/getdatasheetpartid-251804-26829547.pdf?src-supplier=Verical; Design Item ID: CC0805KRX7R0BB223; Component Type: Standard; Pin Count: 2; Source: V4-TEL.SCHLIB; Component Type: Capacitors
footprint 0805
pins: 1, 2

## CMP-001-00185-1
designator C?  value 470uF 6.3V  (hidden comment: CMP-001-00185-1)
ALU Electrolytic; SMD; EDH; +105°C; 6.3VDC; 8µF; 8 x 10.2; Manufacturer: KEMET; Manufacturer Part Number: EDH477M6R3A9MAA; RoHS: Yes; Category: Aluminum Electrolytic Capacitors; Stock 1: 2806; Pricing 1: 1=0.64, 10=0.454, 50=0.343, 100=0.299, 1000=0.221, 10000=0.221 (USD); RoHS Compliant: No; Design Item ID: EDH477M6R3A9MAA; Component Type: Standard; Pin Count: 2; Source: V4-TEL.SCHLIB; Component Type: Capacitors
footprint CAPAE9984X105M 470UF 6.3V
pins: 1, 2
text: +

## CMP-001-00187-1
designator C?  value 100uF 16V  (hidden comment: CMP-001-00187-1)
ALU Electrolytic; SMD; EEV; +105°C; 16VDC; 6.3µF; 6.3 x 5.4; Manufacturer: KEMET; Manufacturer Part Number: EEV107M016S9GAA; RoHS: Yes; Category: Aluminum Electrolytic Capacitors; Stock 1: 216169; Pricing 1: 1=0.46, 10=0.317, 50=0.223, 100=0.191, 1000=0.12, 10000=0.095 (USD); RoHS Compliant: No; Design Item ID: EEV107M016S9GAA; Component Type: Standard; Pin Count: 2; Source: V4-TEL.SCHLIB; Component Type: Capacitors
footprint CAPAE6767X56M 100UF 16V
pins: 1, 2
text: +

## CMP-001-00190-1
designator C?  value 4.7nF  (hidden comment: CMP-001-00190-1)
Cap Ceramic 0.0047uF 50V X7R 10% SMD 0805 125°C Paper T/R; Manufacturer: KEMET; Manufacturer Part Number: C0805C472K5RAC7210; Case/Package: 0805; Dielectric Material: Ceramic; Min Operating Temperature: -55°C; Max Operating Temperature: 125°C; Tolerance: 10%; Dielectric: X7R; Voltage Rating (DC): 50V; Construction: Flat; Length: 2mm; Height: 0.78mm; Depth: 1.25mm; RoHS Compliant: Yes; Mounting Technology: Surface Mount; Pins: 2; Case Code (Imperial): 0805; Case Code (Metric): 2012; Packaging: Tape and Reel; Series: SMD Comm X7R; Termination: SMD/SMT; Weight: 0.000194oz; Width: 1.2mm; Component Type: Capacitors
footprint C0805
pins: 1, 2

## CMP-001-00194-1
designator C?, comment value 820nF  (hidden comment: CC0603KRX7R7BB824)
0603 820 nF 16 V ±10 % Tolerance X7R SMT Multilayer Ceramic Capacitor; Manufacturer: Yageo; Manufacturer Part Number: CC0603KRX7R8BB104; Voltage Rating: 16V; Tolerance: 10%; Case/Package: 0603; Pins: 2; RoHS Compliant: Yes; Min Operating Temperature: -55°C; Max Operating Temperature: 125°C; Case Code (Metric): 1608; Category: Ceramic Capacitors; Depth: 0.8mm; Dielectric: X7R; Halogen Free: Halogen Free; Height: 0.8mm; Lead Free: Lead Free; Length: 1.6mm; Package Quantity: 1; Packaging: Tape and Reel; Radiation Hardening: No; REACH SVHC: Unknown; Resistor Type: Ceramic; RoHS: Yes; Series: CC; Termination: SMD/SMT; Thickness: 0.035inch; Voltage: 16V; Voltage Rating (DC): 16V; Width: 0.8mm; Mounting Technology: Surface Mount; Case Code (Imperial): 0603; Construction: Flat; Dielectric Material: Ceramic; Weight: 7.1E-05oz; Component Type: Capacitors
footprint C0603
pins: 1, 2

## CMP-002-00037-1
designator TP?, comment 5003  (value not drawn)
Test Point, Orange, Height 4.6 mm, Tail Length 3 mm, 1-Pin THD, RoHS; Manufacturer: Keystone; Manufacturer: Keystone Electronics; Case/Package: 5003; RoHS Compliant: True; Datasheet URL: http://keyelco.com/userAssets/file/M65p56.pdf; Mounting Technology: TH; Packaging: Bulk; Package Description: 1-Pin Through Hole Device, Dia 2.54 mm; Pins: 1; Diameter: 2.54mm; Package Reference: 5003; Connector Type: TestPoint; Manufacturer URL: http://www.keyelco.com/; Contact Material: Bronze; Datasheet Version: Jun-15; Contact Plating: Tin; Package Quantity: 10; Colour: Orange; Manufacturer Part Number: 5003; Component Type: Connectors
footprint KSTN-5003 (Test Point, Through Hole, Dia 2.54mm)
pins: 1

## CMP-002-00072-2
designator J?, comment 171825-3  value HDR 3x1, 2.5 mm
EI Series 3 Position 2.5 mm Single Row Through Hole Shrouded Header; Manufacturer: TE Connectivity; Connector Type: Plug,Header,Pin; Voltage Rating: 350V; Approvals: UL; Backwall/Post Interruptions: No (Without); Contact Current Rating: 3.5A; Contact Resistance: 20mR; Mating Alignment: Yes (With); Max Voltage Rating (AC): 250V; Max Voltage Rating (DC): 350.25kV; Number of Contacts: 3; PCB Mount Retention: Without; PCB Mounting Orientation: Vertical; PCB Thickness: 0.063inch; Pitch: 2.5mm; Plating Thickness: 0.8um; Tail Length: 0.142inch; Case/Package: 1000; RoHS Compliant: Yes; Min Operating Temperature: -20°C; Max Operating Temperature: 95°C; Design Item ID: 171825-3; Category: Connectors; Color: Natural; Contact Gender: Male; Contact Material: Brass; Contact Mating Length: 7.5mm; Contact Plating: Copper,Tin; Contact Retention: No (Without); Contact Shape: Square; Contact Type: Male Pin; Current Rating: 3.5A; Depth: 4.9mm; Flammability Rating: UL94 V-0; Height: 0.409inch; Housing Color: Natural; Housing Material: Nylon; Insulation Material: Polyamide; Length: 7.5mm; Manufacturer Part Number: 171825-3; Mating Retention: Yes (With); Number of Positions: 3; Number of Rows: 1; Orientation: Straight; Packaging: Bag; PCB Mount Alignment: No (Without); Pricing 1: 1=0.26000, 10=0.21300, 50=0.21300, 100=0.16500, 500=0.15000, 1000=0.12400, 2000=0.11300, 5000=0.10600, 10000=0.09900, 25000=0.09300 (USD); REACH SVHC: No SVHC; RoHS: Yes; Series: EI; Strain Relief: No (Without); Termination: Solder; Width: 14mm; ComponentLink1Description: https://datasheet.ciiva.com/15175/getdatasheetpartid-40634-15175588.pdf?src-supplier=Verical; ComponentLink1URL: https://datasheet.ciiva.com/15175/getdatasheetpartid-40634-15175588.pdf?src-supplier=Verical; ComponentLink2Description: https://datasheet.ciiva.com/19461/1963001-19461179.pdf?src-supplier=Jameco; ComponentLink2URL: https://datasheet.ciiva.com/19461/1963001-19461179.pdf?src-supplier=Jameco; ComponentLink3Description: https://datasheet.ciiva.com/11750/0900766b80ed54cb-11750348.pdf?src-supplier=RSComponents; ComponentLink3URL: https://datasheet.ciiva.com/11750/0900766b80ed54cb-11750348.pdf?src-supplier=RSComponents; ComponentLink4Description: https://datasheet.ciiva.com/30247/eng-cat-1242174-0698-8-30247015.pdf?src-supplier=Onlinecomponents.com; ComponentLink4URL: https://datasheet.ciiva.com/30247/eng-cat-1242174-0698-8-30247015.pdf?src-supplier=Onlinecomponents.com; ComponentLink5Description: https://datasheet.ciiva.com/6857/eng-cd-171825-y2-171825-c-6857228.pdf?src-supplier=Digi-Key; ComponentLink5URL: https://datasheet.ciiva.com/6857/eng-cd-171825-y2-171825-c-6857228.pdf?src-supplier=Digi-Key; Mounting Technology: Through Hole; Pins: 3; Component Type: Connectors
footprint HDR_MALE_1x3_2.5MM_AMP EI_VERT
pins: 1, 2, 3

## CMP-002-00163-4
designator P?  (value not drawn)  (mechanical)
2 Position 2.5 mm Crimp Terminal Receptacle Housing Connector; Manufacturer: TE Connectivity; Manufacturer Part Number: 171822-2; Connector Type: Receptacle,Socket; PCB Mount Retention: Without; Contact Current Rating: 2A; Insulation Resistance: 500MR; Number of Positions: 2; Mating Alignment: Yes (With); Strain Relief: No (Without); Pitch: 2.5mm; Approvals: UL; RoHS: Yes; Category: Connectors; Stock 1: 25549; Pricing 1: 1=0.24000, 10=0.16100, 50=0.16100, 100=0.13500, 1000=0.11000, 10000=0.10800 (USD); Mount: Free Hanging,Cable; Housing Color: Natural; Housing Material: Nylon; Color: Natural; Insulation Material: Polyamide; Material: Nylon; Min Operating Temperature: -20°C; Max Operating Temperature: 95°C; Series: EI; Packaging: Bag; Termination: Crimp; Orientation: Straight; Contact Type: Female Socket; Number of Rows: 1; Gender: Receptacle; Contact Gender: Female; Number of Contacts: 2; Mating Retention: Yes (With); Mating Connector Lock: Yes (With); Length: 14mm; Width: 14mm; Height: 5.75mm; Depth: 14mm; RoHS Compliant: Yes; ELV: Compliant; Lead Free: Lead Free; Flammability Rating: UL94 V-0; Reach SVHC Compliant: Yes; ComponentLink1URL: https://datasheet.ciiva.com/5795/1504042-5795504.pdf?src-supplier=Farnell; ComponentLink1Description: https://datasheet.ciiva.com/5795/1504042-5795504.pdf?src-supplier=Farnell; ComponentLink2URL: https://datasheet.ciiva.com/15178/getdatasheetpartid-138116-15178665.pdf?src-supplier=Verical; ComponentLink2Description: https://datasheet.ciiva.com/15178/getdatasheetpartid-138116-15178665.pdf?src-supplier=Verical; ComponentLink3URL: https://datasheet.ciiva.com/16321/tyco20171822-2-16321341.pdf?src-supplier=Future+Electronics; ComponentLink3Description: https://datasheet.ciiva.com/16321/tyco20171822-2-16321341.pdf?src-supplier=Future+Electronics; ComponentLink4URL: https://datasheet.ciiva.com/23813/573455-23813958.pdf?src-supplier=Newark; ComponentLink4Description: https://datasheet.ciiva.com/23813/573455-23813958.pdf?src-supplier=Newark; ComponentLink5URL: https://datasheet.ciiva.com/11740/0900766b80d9a1b1-11740548.pdf?src-supplier=Rs; ComponentLink5Description: https://datasheet.ciiva.com/11740/0900766b80d9a1b1-11740548.pdf?src-supplier=Rs; ComponentLink6URL: https://datasheet.ciiva.com/762/eng-cd-171822-l2-762908.pdf?src-supplier=Digi-Key; ComponentLink6Description: https://datasheet.ciiva.com/762/eng-cd-171822-l2-762908.pdf?src-supplier=Digi-Key; ComponentLink7URL: https://datasheet.ciiva.com/30108/pgurl-0-171822-2-0-30108319.pdf?src-supplier=Onlinecomponents.com; ComponentLink7Description: https://datasheet.ciiva.com/30108/pgurl-0-171822-2-0-30108319.pdf?src-supplier=Onlinecomponents.com; Case/Package: 1000; Pins: 0; Design Item ID: 171822-2; Component Type: Mechanical; Current Rating: 2A; Source: PTZ.SCHLIB